# Altium schematic symbol library jlcpcb_2025_04_resistors_extended_0201.schlib: 1508 symbols (part 4 of 8)
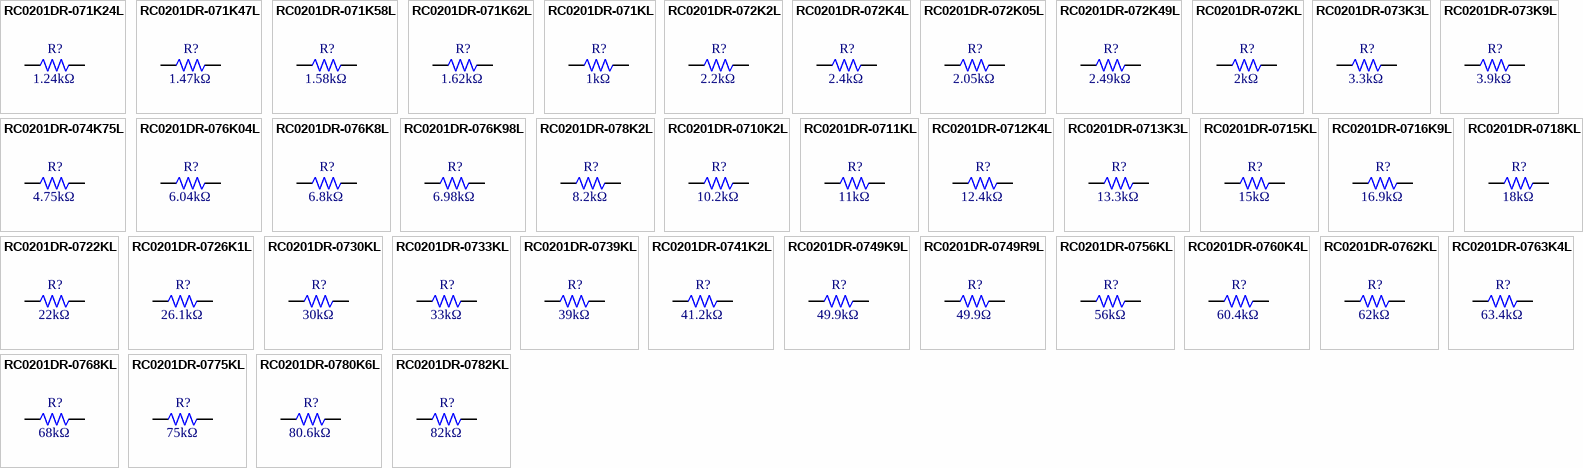
[diagram p40: symbols RC0201DR-071K24L to RC0201DR-0782KL]

## RC0201DR-0739KL
designator R?  Resistance: 39kΩ  (hidden comment: *)
Resistor, 39kΩ, ±0.5%, 50mW, ±200ppm/℃, -55℃~+125℃, SMD 0201; Manufacturer: Uniroyal; Manufacturer Part Number: RC0201DR-0739KL; Supplier 1: LCSC; Supplier Part Number 1: C851727; JLCPCB Part Number: C851727; Power Rating: 50mW; Category: Resistors; Package Size: 0201; JLCPCB Basic Part: Yes; Tolerance: ±0.5%; Temperature Coefficient: ±200ppm/℃; Temperature Rating: -55℃~+125℃; ComponentLink1Description: Datasheet; ComponentLink1URL: https://wmsc.lcsc.com/wmsc/upload/file/pdf/v2/lcsc/2207080300_YAGEO-RC0201DR-0739KL_C851727.pdf; ComponentLink2Description: JLCPCB Part URL; ComponentLink2URL: https://jlcpcb.com/partdetail/C851727
pins: 1, 2
1 alternate drawing of the same symbol

## RC0201DR-0741K2L
designator R?  Resistance: 41.2kΩ  (hidden comment: *)
Resistor, 41.2kΩ, ±0.5%, 50mW, ±200ppm/℃, -55℃~+125℃, SMD 0201; Manufacturer: Uniroyal; Manufacturer Part Number: RC0201DR-0741K2L; Supplier 1: LCSC; Supplier Part Number 1: C851736; JLCPCB Part Number: C851736; Power Rating: 50mW; Category: Resistors; Package Size: 0201; JLCPCB Basic Part: Yes; Tolerance: ±0.5%; Temperature Coefficient: ±200ppm/℃; Temperature Rating: -55℃~+125℃; ComponentLink1Description: Datasheet; ComponentLink1URL: https://wmsc.lcsc.com/wmsc/upload/file/pdf/v2/lcsc/2210190401_YAGEO-RC0201DR-0741K2L_C851736.pdf; ComponentLink2Description: JLCPCB Part URL; ComponentLink2URL: https://jlcpcb.com/partdetail/C851736
pins: 1, 2
1 alternate drawing of the same symbol

## RC0201DR-0749K9L
designator R?  Resistance: 49.9kΩ  (hidden comment: *)
Resistor, 49.9kΩ, ±0.5%, 50mW, ±200ppm/℃, -55℃~+125℃, SMD 0201; Manufacturer: Uniroyal; Manufacturer Part Number: RC0201DR-0749K9L; Supplier 1: LCSC; Supplier Part Number 1: C851750; JLCPCB Part Number: C851750; Power Rating: 50mW; Category: Resistors; Package Size: 0201; JLCPCB Basic Part: Yes; Tolerance: ±0.5%; Temperature Coefficient: ±200ppm/℃; Temperature Rating: -55℃~+125℃; ComponentLink1Description: Datasheet; ComponentLink1URL: https://wmsc.lcsc.com/wmsc/upload/file/pdf/v2/lcsc/2210190401_YAGEO-RC0201DR-0749K9L_C851750.pdf; ComponentLink2Description: JLCPCB Part URL; ComponentLink2URL: https://jlcpcb.com/partdetail/C851750
pins: 1, 2
1 alternate drawing of the same symbol

## RC0201DR-0749R9L
designator R?  Resistance: 49.9Ω  (hidden comment: *)
Resistor, 49.9Ω, ±0.5%, 50mW, 25V, ±200ppm/℃, -55℃~+125℃, SMD 0201; Manufacturer: Uniroyal; Manufacturer Part Number: RC0201DR-0749R9L; Supplier 1: LCSC; Supplier Part Number 1: C851751; JLCPCB Part Number: C851751; Power Rating: 50mW; Category: Resistors; Package Size: 0201; JLCPCB Basic Part: Yes; Tolerance: ±0.5%; Voltage Rating: 25V; Temperature Coefficient: ±200ppm/℃; Temperature Rating: -55℃~+125℃; ComponentLink1Description: Datasheet; ComponentLink1URL: https://wmsc.lcsc.com/wmsc/upload/file/pdf/v2/lcsc/2203031730_YAGEO-RC0201DR-0749R9L_C851751.pdf; ComponentLink2Description: JLCPCB Part URL; ComponentLink2URL: https://jlcpcb.com/partdetail/C851751
pins: 1, 2
1 alternate drawing of the same symbol

## RC0201DR-0756KL
designator R?  Resistance: 56kΩ  (hidden comment: *)
Resistor, 56kΩ, ±0.5%, 50mW, 25V, ±200ppm/℃, -55℃~+125℃, SMD 0201; Manufacturer: Uniroyal; Manufacturer Part Number: RC0201DR-0756KL; Supplier 1: LCSC; Supplier Part Number 1: C851761; JLCPCB Part Number: C851761; Power Rating: 50mW; Category: Resistors; Package Size: 0201; JLCPCB Basic Part: Yes; Tolerance: ±0.5%; Voltage Rating: 25V; Temperature Coefficient: ±200ppm/℃; Temperature Rating: -55℃~+125℃; ComponentLink1Description: Datasheet; ComponentLink1URL: https://wmsc.lcsc.com/wmsc/upload/file/pdf/v2/lcsc/2203031730_YAGEO-RC0201DR-0756KL_C851761.pdf; ComponentLink2Description: JLCPCB Part URL; ComponentLink2URL: https://jlcpcb.com/partdetail/C851761
pins: 1, 2
1 alternate drawing of the same symbol

## RC0201DR-0760K4L
designator R?  Resistance: 60.4kΩ  (hidden comment: *)
Resistor, 60.4kΩ, ±0.5%, 50mW, 25V, ±200ppm/℃, -55℃~+125℃, SMD 0201; Manufacturer: Uniroyal; Manufacturer Part Number: RC0201DR-0760K4L; Supplier 1: LCSC; Supplier Part Number 1: C2110918; JLCPCB Part Number: C2110918; Power Rating: 50mW; Category: Resistors; Package Size: 0201; JLCPCB Basic Part: Yes; Tolerance: ±0.5%; Voltage Rating: 25V; Temperature Coefficient: ±200ppm/℃; Temperature Rating: -55℃~+125℃; ComponentLink1Description: Datasheet; ComponentLink1URL: https://wmsc.lcsc.com/wmsc/upload/file/pdf/v2/lcsc/2202021530_YAGEO-RC0201DR-0760K4L_C2110918.pdf; ComponentLink2Description: JLCPCB Part URL; ComponentLink2URL: https://jlcpcb.com/partdetail/C2110918
pins: 1, 2
1 alternate drawing of the same symbol

## RC0201DR-0762KL
designator R?  Resistance: 62kΩ  (hidden comment: *)
Resistor, 62kΩ, ±0.5%, 50mW, ±200ppm/℃, -55℃~+125℃, SMD 0201; Manufacturer: Uniroyal; Manufacturer Part Number: RC0201DR-0762KL; Supplier 1: LCSC; Supplier Part Number 1: C851773; JLCPCB Part Number: C851773; Power Rating: 50mW; Category: Resistors; Package Size: 0201; JLCPCB Basic Part: Yes; Tolerance: ±0.5%; Temperature Coefficient: ±200ppm/℃; Temperature Rating: -55℃~+125℃; ComponentLink1Description: Datasheet; ComponentLink1URL: https://wmsc.lcsc.com/wmsc/upload/file/pdf/v2/lcsc/2210190401_YAGEO-RC0201DR-0762KL_C851773.pdf; ComponentLink2Description: JLCPCB Part URL; ComponentLink2URL: https://jlcpcb.com/partdetail/C851773
pins: 1, 2
1 alternate drawing of the same symbol

## RC0201DR-0763K4L
designator R?  Resistance: 63.4kΩ  (hidden comment: *)
Resistor, 63.4kΩ, ±0.5%, 50mW, ±200ppm/℃, -55℃~+125℃, SMD 0201; Manufacturer: Uniroyal; Manufacturer Part Number: RC0201DR-0763K4L; Supplier 1: LCSC; Supplier Part Number 1: C851774; JLCPCB Part Number: C851774; Power Rating: 50mW; Category: Resistors; Package Size: 0201; JLCPCB Basic Part: Yes; Tolerance: ±0.5%; Temperature Coefficient: ±200ppm/℃; Temperature Rating: -55℃~+125℃; ComponentLink1Description: Datasheet; ComponentLink1URL: https://wmsc.lcsc.com/wmsc/upload/file/pdf/v2/lcsc/2210190401_YAGEO-RC0201DR-0763K4L_C851774.pdf; ComponentLink2Description: JLCPCB Part URL; ComponentLink2URL: https://jlcpcb.com/partdetail/C851774
pins: 1, 2
1 alternate drawing of the same symbol

## RC0201DR-0768KL
designator R?  Resistance: 68kΩ  (hidden comment: *)
Resistor, 68kΩ, ±0.5%, 50mW, ±200ppm/℃, -55℃~+125℃, SMD 0201; Manufacturer: Uniroyal; Manufacturer Part Number: RC0201DR-0768KL; Supplier 1: LCSC; Supplier Part Number 1: C851782; JLCPCB Part Number: C851782; Power Rating: 50mW; Category: Resistors; Package Size: 0201; JLCPCB Basic Part: Yes; Tolerance: ±0.5%; Temperature Coefficient: ±200ppm/℃; Temperature Rating: -55℃~+125℃; ComponentLink1Description: Datasheet; ComponentLink1URL: https://wmsc.lcsc.com/wmsc/upload/file/pdf/v2/lcsc/2210190401_YAGEO-RC0201DR-0768KL_C851782.pdf; ComponentLink2Description: JLCPCB Part URL; ComponentLink2URL: https://jlcpcb.com/partdetail/C851782
pins: 1, 2
1 alternate drawing of the same symbol

## RC0201DR-0775KL
designator R?  Resistance: 75kΩ  (hidden comment: *)
Resistor, 75kΩ, ±0.5%, 50mW, ±200ppm/℃, -55℃~+125℃, SMD 0201; Manufacturer: Uniroyal; Manufacturer Part Number: RC0201DR-0775KL; Supplier 1: LCSC; Supplier Part Number 1: C851792; JLCPCB Part Number: C851792; Power Rating: 50mW; Category: Resistors; Package Size: 0201; JLCPCB Basic Part: Yes; Tolerance: ±0.5%; Temperature Coefficient: ±200ppm/℃; Temperature Rating: -55℃~+125℃; ComponentLink1Description: Datasheet; ComponentLink1URL: https://wmsc.lcsc.com/wmsc/upload/file/pdf/v2/lcsc/2210190401_YAGEO-RC0201DR-0775KL_C851792.pdf; ComponentLink2Description: JLCPCB Part URL; ComponentLink2URL: https://jlcpcb.com/partdetail/C851792
pins: 1, 2
1 alternate drawing of the same symbol

## RC0201DR-0780K6L
designator R?  Resistance: 80.6kΩ  (hidden comment: *)
Resistor, 80.6kΩ, ±0.5%, 50mW, ±200ppm/℃, -55℃~+125℃, SMD 0201; Manufacturer: Uniroyal; Manufacturer Part Number: RC0201DR-0780K6L; Supplier 1: LCSC; Supplier Part Number 1: C851797; JLCPCB Part Number: C851797; Power Rating: 50mW; Category: Resistors; Package Size: 0201; JLCPCB Basic Part: Yes; Tolerance: ±0.5%; Temperature Coefficient: ±200ppm/℃; Temperature Rating: -55℃~+125℃; ComponentLink1Description: Datasheet; ComponentLink1URL: https://wmsc.lcsc.com/wmsc/upload/file/pdf/v2/lcsc/2311211101_YAGEO-RC0201DR-0780K6L_C851797.pdf; ComponentLink2Description: JLCPCB Part URL; ComponentLink2URL: https://jlcpcb.com/partdetail/C851797
pins: 1, 2
1 alternate drawing of the same symbol

## RC0201DR-0782KL
designator R?  Resistance: 82kΩ  (hidden comment: *)
Resistor, 82kΩ, ±0.5%, 50mW, ±200ppm/℃, -55℃~+125℃, SMD 0201; Manufacturer: Uniroyal; Manufacturer Part Number: RC0201DR-0782KL; Supplier 1: LCSC; Supplier Part Number 1: C851800; JLCPCB Part Number: C851800; Power Rating: 50mW; Category: Resistors; Package Size: 0201; JLCPCB Basic Part: Yes; Tolerance: ±0.5%; Temperature Coefficient: ±200ppm/℃; Temperature Rating: -55℃~+125℃; ComponentLink1Description: Datasheet; ComponentLink1URL: https://wmsc.lcsc.com/wmsc/upload/file/pdf/v2/lcsc/2210190401_YAGEO-RC0201DR-0782KL_C851800.pdf; ComponentLink2Description: JLCPCB Part URL; ComponentLink2URL: https://jlcpcb.com/partdetail/C851800
pins: 1, 2
1 alternate drawing of the same symbol

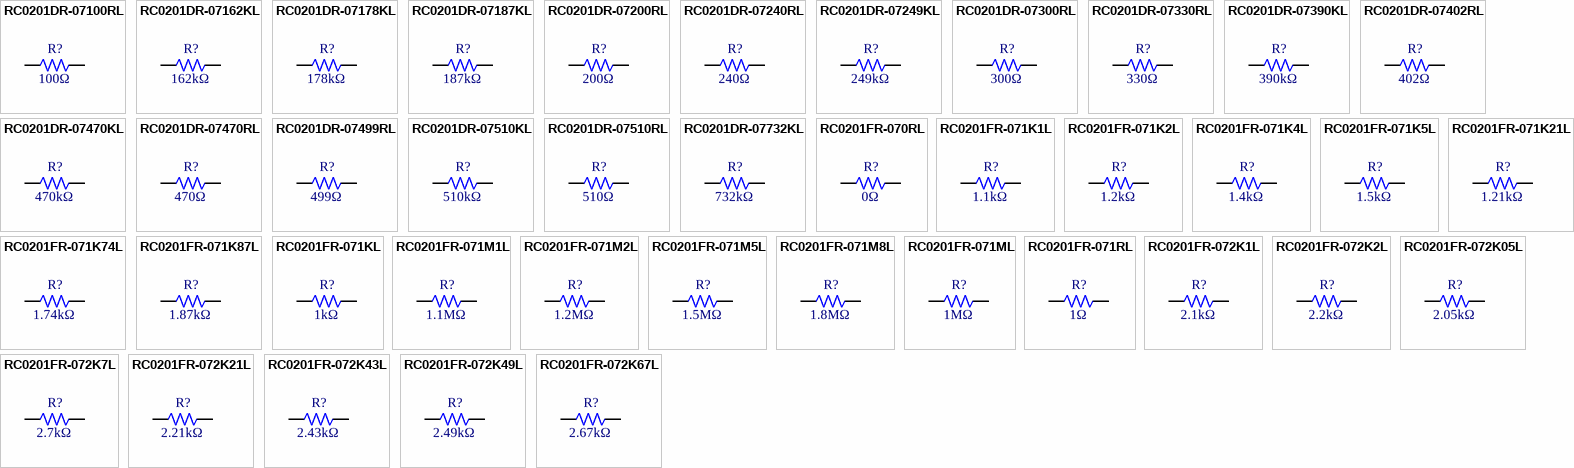
[diagram p15: symbols RC0201DR-07100RL to RC0201FR-072K67L]

## RC0201DR-07100RL
designator R?  Resistance: 100Ω  (hidden comment: *)
Resistor, 100Ω, ±0.5%, 50mW, ±200ppm/℃, -55℃~+125℃, SMD 0201; Manufacturer: Uniroyal; Manufacturer Part Number: RC0201DR-07100RL; Supplier 1: LCSC; Supplier Part Number 1: C851634; JLCPCB Part Number: C851634; Power Rating: 50mW; Category: Resistors; Package Size: 0201; JLCPCB Basic Part: Yes; Tolerance: ±0.5%; Temperature Coefficient: ±200ppm/℃; Temperature Rating: -55℃~+125℃; ComponentLink1Description: Datasheet; ComponentLink1URL: https://wmsc.lcsc.com/wmsc/upload/file/pdf/v2/lcsc/2210190401_YAGEO-RC0201DR-07100RL_C851634.pdf; ComponentLink2Description: JLCPCB Part URL; ComponentLink2URL: https://jlcpcb.com/partdetail/C851634
pins: 1, 2
1 alternate drawing of the same symbol

## RC0201DR-07162KL
designator R?  Resistance: 162kΩ  (hidden comment: *)
Resistor, 162kΩ, ±0.5%, 50mW, 25V, ±200ppm/℃, -55℃~+125℃, SMD 0201; Manufacturer: Uniroyal; Manufacturer Part Number: RC0201DR-07162KL; Supplier 1: LCSC; Supplier Part Number 1: C2108610; JLCPCB Part Number: C2108610; Power Rating: 50mW; Category: Resistors; Package Size: 0201; JLCPCB Basic Part: Yes; Tolerance: ±0.5%; Voltage Rating: 25V; Temperature Coefficient: ±200ppm/℃; Temperature Rating: -55℃~+125℃; ComponentLink1Description: Datasheet; ComponentLink1URL: https://wmsc.lcsc.com/wmsc/upload/file/pdf/v2/lcsc/2202021400_YAGEO-RC0201DR-07162KL_C2108610.pdf; ComponentLink2Description: JLCPCB Part URL; ComponentLink2URL: https://jlcpcb.com/partdetail/C2108610
pins: 1, 2
1 alternate drawing of the same symbol

## RC0201DR-07178KL
designator R?  Resistance: 178kΩ  (hidden comment: *)
Resistor, 178kΩ, ±0.5%, 50mW, ±200ppm/℃, -55℃~+125℃, SMD 0201; Manufacturer: Uniroyal; Manufacturer Part Number: RC0201DR-07178KL; Supplier 1: LCSC; Supplier Part Number 1: C851659; JLCPCB Part Number: C851659; Power Rating: 50mW; Category: Resistors; Package Size: 0201; JLCPCB Basic Part: Yes; Tolerance: ±0.5%; Temperature Coefficient: ±200ppm/℃; Temperature Rating: -55℃~+125℃; ComponentLink1Description: Datasheet; ComponentLink1URL: https://wmsc.lcsc.com/wmsc/upload/file/pdf/v2/lcsc/2210190401_YAGEO-RC0201DR-07178KL_C851659.pdf; ComponentLink2Description: JLCPCB Part URL; ComponentLink2URL: https://jlcpcb.com/partdetail/C851659
pins: 1, 2
1 alternate drawing of the same symbol

## RC0201DR-07187KL
designator R?  Resistance: 187kΩ  (hidden comment: *)
Resistor, 187kΩ, ±0.5%, 50mW, ±200ppm/℃, -55℃~+125℃, SMD 0201; Manufacturer: Uniroyal; Manufacturer Part Number: RC0201DR-07187KL; Supplier 1: LCSC; Supplier Part Number 1: C851661; JLCPCB Part Number: C851661; Power Rating: 50mW; Category: Resistors; Package Size: 0201; JLCPCB Basic Part: Yes; Tolerance: ±0.5%; Temperature Coefficient: ±200ppm/℃; Temperature Rating: -55℃~+125℃; ComponentLink1Description: Datasheet; ComponentLink1URL: https://wmsc.lcsc.com/wmsc/upload/file/pdf/v2/lcsc/2210190401_YAGEO-RC0201DR-07187KL_C851661.pdf; ComponentLink2Description: JLCPCB Part URL; ComponentLink2URL: https://jlcpcb.com/partdetail/C851661
pins: 1, 2
1 alternate drawing of the same symbol

## RC0201DR-07200RL
designator R?  Resistance: 200Ω  (hidden comment: *)
Resistor, 200Ω, ±0.5%, 50mW, ±200ppm/℃, -55℃~+125℃, SMD 0201; Manufacturer: Uniroyal; Manufacturer Part Number: RC0201DR-07200RL; Supplier 1: LCSC; Supplier Part Number 1: C851677; JLCPCB Part Number: C851677; Power Rating: 50mW; Category: Resistors; Package Size: 0201; JLCPCB Basic Part: Yes; Tolerance: ±0.5%; Temperature Coefficient: ±200ppm/℃; Temperature Rating: -55℃~+125℃; ComponentLink1Description: Datasheet; ComponentLink1URL: https://wmsc.lcsc.com/wmsc/upload/file/pdf/v2/lcsc/2210190401_YAGEO-RC0201DR-07200RL_C851677.pdf; ComponentLink2Description: JLCPCB Part URL; ComponentLink2URL: https://jlcpcb.com/partdetail/C851677
pins: 1, 2
1 alternate drawing of the same symbol

## RC0201DR-07240RL
designator R?  Resistance: 240Ω  (hidden comment: *)
Resistor, 240Ω, ±0.5%, 50mW, ±200ppm/℃, -55℃~+125℃, SMD 0201; Manufacturer: Uniroyal; Manufacturer Part Number: RC0201DR-07240RL; Supplier 1: LCSC; Supplier Part Number 1: C851687; JLCPCB Part Number: C851687; Power Rating: 50mW; Category: Resistors; Package Size: 0201; JLCPCB Basic Part: Yes; Tolerance: ±0.5%; Temperature Coefficient: ±200ppm/℃; Temperature Rating: -55℃~+125℃; ComponentLink1Description: Datasheet; ComponentLink1URL: https://wmsc.lcsc.com/wmsc/upload/file/pdf/v2/lcsc/2311211101_YAGEO-RC0201DR-07240RL_C851687.pdf; ComponentLink2Description: JLCPCB Part URL; ComponentLink2URL: https://jlcpcb.com/partdetail/C851687
pins: 1, 2
1 alternate drawing of the same symbol

## RC0201DR-07249KL
designator R?  Resistance: 249kΩ  (hidden comment: *)
Resistor, 249kΩ, ±0.5%, 50mW, 25V, ±200ppm/℃, -55℃~+125℃, SMD 0201; Manufacturer: Uniroyal; Manufacturer Part Number: RC0201DR-07249KL; Supplier 1: LCSC; Supplier Part Number 1: C2108970; JLCPCB Part Number: C2108970; Power Rating: 50mW; Category: Resistors; Package Size: 0201; JLCPCB Basic Part: Yes; Tolerance: ±0.5%; Voltage Rating: 25V; Temperature Coefficient: ±200ppm/℃; Temperature Rating: -55℃~+125℃; ComponentLink1Description: Datasheet; ComponentLink1URL: https://wmsc.lcsc.com/wmsc/upload/file/pdf/v2/lcsc/2202021400_YAGEO-RC0201DR-07249KL_C2108970.pdf; ComponentLink2Description: JLCPCB Part URL; ComponentLink2URL: https://jlcpcb.com/partdetail/C2108970
pins: 1, 2
1 alternate drawing of the same symbol

## RC0201DR-07300RL
designator R?  Resistance: 300Ω  (hidden comment: *)
Resistor, 300Ω, ±0.5%, 50mW, ±200ppm/℃, -55℃~+125℃, SMD 0201; Manufacturer: Uniroyal; Manufacturer Part Number: RC0201DR-07300RL; Supplier 1: LCSC; Supplier Part Number 1: C851711; JLCPCB Part Number: C851711; Power Rating: 50mW; Category: Resistors; Package Size: 0201; JLCPCB Basic Part: Yes; Tolerance: ±0.5%; Temperature Coefficient: ±200ppm/℃; Temperature Rating: -55℃~+125℃; ComponentLink1Description: Datasheet; ComponentLink1URL: https://wmsc.lcsc.com/wmsc/upload/file/pdf/v2/lcsc/2210190401_YAGEO-RC0201DR-07300RL_C851711.pdf; ComponentLink2Description: JLCPCB Part URL; ComponentLink2URL: https://jlcpcb.com/partdetail/C851711
pins: 1, 2
1 alternate drawing of the same symbol

## RC0201DR-07330RL
designator R?  Resistance: 330Ω  (hidden comment: *)
Resistor, 330Ω, ±0.5%, 50mW, 25V, ±200ppm/℃, -55℃~+125℃, SMD 0201; Manufacturer: Uniroyal; Manufacturer Part Number: RC0201DR-07330RL; Supplier 1: LCSC; Supplier Part Number 1: C851717; JLCPCB Part Number: C851717; Power Rating: 50mW; Category: Resistors; Package Size: 0201; JLCPCB Basic Part: Yes; Tolerance: ±0.5%; Voltage Rating: 25V; Temperature Coefficient: ±200ppm/℃; Temperature Rating: -55℃~+125℃; ComponentLink1Description: Datasheet; ComponentLink1URL: https://wmsc.lcsc.com/wmsc/upload/file/pdf/v2/lcsc/2203031730_YAGEO-RC0201DR-07330RL_C851717.pdf; ComponentLink2Description: JLCPCB Part URL; ComponentLink2URL: https://jlcpcb.com/partdetail/C851717
pins: 1, 2
1 alternate drawing of the same symbol

## RC0201DR-07390KL
designator R?  Resistance: 390kΩ  (hidden comment: *)
Resistor, 390kΩ, ±0.5%, 50mW, ±200ppm/℃, -55℃~+125℃, SMD 0201; Manufacturer: Uniroyal; Manufacturer Part Number: RC0201DR-07390KL; Supplier 1: LCSC; Supplier Part Number 1: C851726; JLCPCB Part Number: C851726; Power Rating: 50mW; Category: Resistors; Package Size: 0201; JLCPCB Basic Part: Yes; Tolerance: ±0.5%; Temperature Coefficient: ±200ppm/℃; Temperature Rating: -55℃~+125℃; ComponentLink1Description: Datasheet; ComponentLink1URL: https://wmsc.lcsc.com/wmsc/upload/file/pdf/v2/lcsc/2210190401_YAGEO-RC0201DR-07390KL_C851726.pdf; ComponentLink2Description: JLCPCB Part URL; ComponentLink2URL: https://jlcpcb.com/partdetail/C851726
pins: 1, 2
1 alternate drawing of the same symbol

## RC0201DR-07402RL
designator R?  Resistance: 402Ω  (hidden comment: *)
Resistor, 402Ω, ±0.5%, 50mW, ±200ppm/℃, -55℃~+125℃, SMD 0201; Manufacturer: Uniroyal; Manufacturer Part Number: RC0201DR-07402RL; Supplier 1: LCSC; Supplier Part Number 1: C851735; JLCPCB Part Number: C851735; Power Rating: 50mW; Category: Resistors; Package Size: 0201; JLCPCB Basic Part: Yes; Tolerance: ±0.5%; Temperature Coefficient: ±200ppm/℃; Temperature Rating: -55℃~+125℃; ComponentLink1Description: Datasheet; ComponentLink1URL: https://wmsc.lcsc.com/wmsc/upload/file/pdf/v2/lcsc/2210190401_YAGEO-RC0201DR-07402RL_C851735.pdf; ComponentLink2Description: JLCPCB Part URL; ComponentLink2URL: https://jlcpcb.com/partdetail/C851735
pins: 1, 2
1 alternate drawing of the same symbol

## RC0201DR-07470KL
designator R?  Resistance: 470kΩ  (hidden comment: *)
Resistor, 470kΩ, ±0.5%, 50mW, 25V, ±200ppm/℃, -55℃~+125℃, SMD 0201; Manufacturer: Uniroyal; Manufacturer Part Number: RC0201DR-07470KL; Supplier 1: LCSC; Supplier Part Number 1: C851745; JLCPCB Part Number: C851745; Power Rating: 50mW; Category: Resistors; Package Size: 0201; JLCPCB Basic Part: Yes; Tolerance: ±0.5%; Voltage Rating: 25V; Temperature Coefficient: ±200ppm/℃; Temperature Rating: -55℃~+125℃; ComponentLink1Description: Datasheet; ComponentLink1URL: https://wmsc.lcsc.com/wmsc/upload/file/pdf/v2/lcsc/2304140030_YAGEO-RC0201DR-07470KL_C851745.pdf; ComponentLink2Description: JLCPCB Part URL; ComponentLink2URL: https://jlcpcb.com/partdetail/C851745
pins: 1, 2
1 alternate drawing of the same symbol

## RC0201DR-07470RL
designator R?  Resistance: 470Ω  (hidden comment: *)
Resistor, 470Ω, ±0.5%, 50mW, ±200ppm/℃, -55℃~+125℃, SMD 0201; Manufacturer: Uniroyal; Manufacturer Part Number: RC0201DR-07470RL; Supplier 1: LCSC; Supplier Part Number 1: C851746; JLCPCB Part Number: C851746; Power Rating: 50mW; Category: Resistors; Package Size: 0201; JLCPCB Basic Part: Yes; Tolerance: ±0.5%; Temperature Coefficient: ±200ppm/℃; Temperature Rating: -55℃~+125℃; ComponentLink1Description: Datasheet; ComponentLink1URL: https://wmsc.lcsc.com/wmsc/upload/file/pdf/v2/lcsc/2210190401_YAGEO-RC0201DR-07470RL_C851746.pdf; ComponentLink2Description: JLCPCB Part URL; ComponentLink2URL: https://jlcpcb.com/partdetail/C851746
pins: 1, 2
1 alternate drawing of the same symbol

## RC0201DR-07499RL
designator R?  Resistance: 499Ω  (hidden comment: *)
Resistor, 499Ω, ±0.5%, 50mW, ±200ppm/℃, -55℃~+125℃, SMD 0201; Manufacturer: Uniroyal; Manufacturer Part Number: RC0201DR-07499RL; Supplier 1: LCSC; Supplier Part Number 1: C851749; JLCPCB Part Number: C851749; Power Rating: 50mW; Category: Resistors; Package Size: 0201; JLCPCB Basic Part: Yes; Tolerance: ±0.5%; Temperature Coefficient: ±200ppm/℃; Temperature Rating: -55℃~+125℃; ComponentLink1Description: Datasheet; ComponentLink1URL: https://wmsc.lcsc.com/wmsc/upload/file/pdf/v2/lcsc/2210190401_YAGEO-RC0201DR-07499RL_C851749.pdf; ComponentLink2Description: JLCPCB Part URL; ComponentLink2URL: https://jlcpcb.com/partdetail/C851749
pins: 1, 2
1 alternate drawing of the same symbol

## RC0201DR-07510KL
designator R?  Resistance: 510kΩ  (hidden comment: *)
Resistor, 510kΩ, ±0.5%, 50mW, ±200ppm/℃, -55℃~+125℃, SMD 0201; Manufacturer: Uniroyal; Manufacturer Part Number: RC0201DR-07510KL; Supplier 1: LCSC; Supplier Part Number 1: C851756; JLCPCB Part Number: C851756; Power Rating: 50mW; Category: Resistors; Package Size: 0201; JLCPCB Basic Part: Yes; Tolerance: ±0.5%; Temperature Coefficient: ±200ppm/℃; Temperature Rating: -55℃~+125℃; ComponentLink1Description: Datasheet; ComponentLink1URL: https://wmsc.lcsc.com/wmsc/upload/file/pdf/v2/lcsc/2210190401_YAGEO-RC0201DR-07510KL_C851756.pdf; ComponentLink2Description: JLCPCB Part URL; ComponentLink2URL: https://jlcpcb.com/partdetail/C851756
pins: 1, 2
1 alternate drawing of the same symbol

## RC0201DR-07510RL
designator R?  Resistance: 510Ω  (hidden comment: *)
Resistor, 510Ω, ±0.5%, 50mW, ±200ppm/℃, -55℃~+125℃, SMD 0201; Manufacturer: Uniroyal; Manufacturer Part Number: RC0201DR-07510RL; Supplier 1: LCSC; Supplier Part Number 1: C851757; JLCPCB Part Number: C851757; Power Rating: 50mW; Category: Resistors; Package Size: 0201; JLCPCB Basic Part: Yes; Tolerance: ±0.5%; Temperature Coefficient: ±200ppm/℃; Temperature Rating: -55℃~+125℃; ComponentLink1Description: Datasheet; ComponentLink1URL: https://wmsc.lcsc.com/wmsc/upload/file/pdf/v2/lcsc/2210190401_YAGEO-RC0201DR-07510RL_C851757.pdf; ComponentLink2Description: JLCPCB Part URL; ComponentLink2URL: https://jlcpcb.com/partdetail/C851757
pins: 1, 2
1 alternate drawing of the same symbol

## RC0201DR-07732KL
designator R?  Resistance: 732kΩ  (hidden comment: *)
Resistor, 732kΩ, ±0.5%, 50mW, ±200ppm/℃, -55℃~+125℃, SMD 0201; Manufacturer: Uniroyal; Manufacturer Part Number: RC0201DR-07732KL; Supplier 1: LCSC; Supplier Part Number 1: C851791; JLCPCB Part Number: C851791; Power Rating: 50mW; Category: Resistors; Package Size: 0201; JLCPCB Basic Part: Yes; Tolerance: ±0.5%; Temperature Coefficient: ±200ppm/℃; Temperature Rating: -55℃~+125℃; ComponentLink1Description: Datasheet; ComponentLink1URL: https://wmsc.lcsc.com/wmsc/upload/file/pdf/v2/lcsc/2210190401_YAGEO-RC0201DR-07732KL_C851791.pdf; ComponentLink2Description: JLCPCB Part URL; ComponentLink2URL: https://jlcpcb.com/partdetail/C851791
pins: 1, 2
1 alternate drawing of the same symbol

## RC0201FR-070RL
designator R?  Resistance: 0Ω  (hidden comment: *)
Resistor, 0Ω, 50mW, 25V, -55℃~+125℃, SMD 0201; Manufacturer: Uniroyal; Manufacturer Part Number: RC0201FR-070RL; Supplier 1: LCSC; Supplier Part Number 1: C106227; JLCPCB Part Number: C106227; Power Rating: 50mW; Category: Resistors; Package Size: 0201; JLCPCB Basic Part: Yes; Voltage Rating: 25V; Temperature Rating: -55℃~+125℃; ComponentLink1Description: Datasheet; ComponentLink1URL: https://wmsc.lcsc.com/wmsc/upload/file/pdf/v2/lcsc/2304140030_YAGEO-RC0201FR-070RL_C106227.pdf; ComponentLink2Description: JLCPCB Part URL; ComponentLink2URL: https://jlcpcb.com/partdetail/C106227
pins: 1, 2
1 alternate drawing of the same symbol

## RC0201FR-071K1L
designator R?  Resistance: 1.1kΩ  (hidden comment: *)
Resistor, 1.1kΩ, ±1%, 50mW, 25V, ±200ppm/℃, -55℃~+125℃, SMD 0201; Manufacturer: Uniroyal; Manufacturer Part Number: RC0201FR-071K1L; Supplier 1: LCSC; Supplier Part Number 1: C295782; JLCPCB Part Number: C295782; Power Rating: 50mW; Category: Resistors; Package Size: 0201; JLCPCB Basic Part: Yes; Tolerance: ±1%; Voltage Rating: 25V; Temperature Coefficient: ±200ppm/℃; Temperature Rating: -55℃~+125℃; ComponentLink1Description: Datasheet; ComponentLink1URL: https://wmsc.lcsc.com/wmsc/upload/file/pdf/v2/lcsc/2304140030_YAGEO-RC0201FR-071K1L_C295782.pdf; ComponentLink2Description: JLCPCB Part URL; ComponentLink2URL: https://jlcpcb.com/partdetail/C295782
pins: 1, 2
1 alternate drawing of the same symbol

## RC0201FR-071K2L
designator R?  Resistance: 1.2kΩ  (hidden comment: *)
Resistor, 1.2kΩ, ±1%, 50mW, 25V, ±200ppm/℃, -55℃~+125℃, SMD 0201; Manufacturer: Uniroyal; Manufacturer Part Number: RC0201FR-071K2L; Supplier 1: LCSC; Supplier Part Number 1: C327393; JLCPCB Part Number: C327393; Power Rating: 50mW; Category: Resistors; Package Size: 0201; JLCPCB Basic Part: Yes; Tolerance: ±1%; Voltage Rating: 25V; Temperature Coefficient: ±200ppm/℃; Temperature Rating: -55℃~+125℃; ComponentLink1Description: Datasheet; ComponentLink1URL: https://wmsc.lcsc.com/wmsc/upload/file/pdf/v2/lcsc/1811141154_YAGEO-RC0201FR-071K2L_C327393.pdf; ComponentLink2Description: JLCPCB Part URL; ComponentLink2URL: https://jlcpcb.com/partdetail/C327393
pins: 1, 2
1 alternate drawing of the same symbol

## RC0201FR-071K4L
designator R?  Resistance: 1.4kΩ  (hidden comment: *)
Resistor, 1.4kΩ, ±1%, 50mW, 25V, ±200ppm/℃, -55℃~+125℃, SMD 0201; Manufacturer: Uniroyal; Manufacturer Part Number: RC0201FR-071K4L; Supplier 1: LCSC; Supplier Part Number 1: C138166; JLCPCB Part Number: C138166; Power Rating: 50mW; Category: Resistors; Package Size: 0201; JLCPCB Basic Part: Yes; Tolerance: ±1%; Voltage Rating: 25V; Temperature Coefficient: ±200ppm/℃; Temperature Rating: -55℃~+125℃; ComponentLink1Description: Datasheet; ComponentLink1URL: https://wmsc.lcsc.com/wmsc/upload/file/pdf/v2/lcsc/2304140030_YAGEO-RC0201FR-071K4L_C138166.pdf; ComponentLink2Description: JLCPCB Part URL; ComponentLink2URL: https://jlcpcb.com/partdetail/C138166
pins: 1, 2
1 alternate drawing of the same symbol

## RC0201FR-071K5L
designator R?  Resistance: 1.5kΩ  (hidden comment: *)
Resistor, 1.5kΩ, ±1%, 50mW, 25V, ±200ppm/℃, -55℃~+125℃, SMD 0201; Manufacturer: Uniroyal; Manufacturer Part Number: RC0201FR-071K5L; Supplier 1: LCSC; Supplier Part Number 1: C155737; JLCPCB Part Number: C155737; Power Rating: 50mW; Category: Resistors; Package Size: 0201; JLCPCB Basic Part: Yes; Tolerance: ±1%; Voltage Rating: 25V; Temperature Coefficient: ±200ppm/℃; Temperature Rating: -55℃~+125℃; ComponentLink1Description: Datasheet; ComponentLink1URL: https://wmsc.lcsc.com/wmsc/upload/file/pdf/v2/lcsc/2011101005_YAGEO-RC0201FR-071K5L_C155737.pdf; ComponentLink2Description: JLCPCB Part URL; ComponentLink2URL: https://jlcpcb.com/partdetail/C155737
pins: 1, 2
1 alternate drawing of the same symbol

## RC0201FR-071K21L
designator R?  Resistance: 1.21kΩ  (hidden comment: *)
Resistor, 1.21kΩ, ±1%, 50mW, 25V, ±200ppm/℃, -55℃~+125℃, SMD 0201; Manufacturer: Uniroyal; Manufacturer Part Number: RC0201FR-071K21L; Supplier 1: LCSC; Supplier Part Number 1: C273264; JLCPCB Part Number: C273264; Power Rating: 50mW; Category: Resistors; Package Size: 0201; JLCPCB Basic Part: Yes; Tolerance: ±1%; Voltage Rating: 25V; Temperature Coefficient: ±200ppm/℃; Temperature Rating: -55℃~+125℃; ComponentLink1Description: Datasheet; ComponentLink1URL: https://wmsc.lcsc.com/wmsc/upload/file/pdf/v2/lcsc/2202281730_YAGEO-RC0201FR-071K21L_C273264.pdf; ComponentLink2Description: JLCPCB Part URL; ComponentLink2URL: https://jlcpcb.com/partdetail/C273264
pins: 1, 2
1 alternate drawing of the same symbol

## RC0201FR-071K74L
designator R?  Resistance: 1.74kΩ  (hidden comment: *)
Resistor, 1.74kΩ, ±1%, 50mW, 25V, ±200ppm/℃, -55℃~+125℃, SMD 0201; Manufacturer: Uniroyal; Manufacturer Part Number: RC0201FR-071K74L; Supplier 1: LCSC; Supplier Part Number 1: C327378; JLCPCB Part Number: C327378; Power Rating: 50mW; Category: Resistors; Package Size: 0201; JLCPCB Basic Part: Yes; Tolerance: ±1%; Voltage Rating: 25V; Temperature Coefficient: ±200ppm/℃; Temperature Rating: -55℃~+125℃; ComponentLink1Description: Datasheet; ComponentLink1URL: https://wmsc.lcsc.com/wmsc/upload/file/pdf/v2/lcsc/1811141242_YAGEO-RC0201FR-071K74L_C327378.pdf; ComponentLink2Description: JLCPCB Part URL; ComponentLink2URL: https://jlcpcb.com/partdetail/C327378
pins: 1, 2
1 alternate drawing of the same symbol

## RC0201FR-071K87L
designator R?  Resistance: 1.87kΩ  (hidden comment: *)
Resistor, 1.87kΩ, ±1%, 50mW, 25V, ±200ppm/℃, -55℃~+125℃, SMD 0201; Manufacturer: Uniroyal; Manufacturer Part Number: RC0201FR-071K87L; Supplier 1: LCSC; Supplier Part Number 1: C474490; JLCPCB Part Number: C474490; Power Rating: 50mW; Category: Resistors; Package Size: 0201; JLCPCB Basic Part: Yes; Tolerance: ±1%; Voltage Rating: 25V; Temperature Coefficient: ±200ppm/℃; Temperature Rating: -55℃~+125℃; ComponentLink1Description: Datasheet; ComponentLink1URL: https://wmsc.lcsc.com/wmsc/upload/file/pdf/v2/lcsc/2311211101_YAGEO-RC0201FR-071K87L_C474490.pdf; ComponentLink2Description: JLCPCB Part URL; ComponentLink2URL: https://jlcpcb.com/partdetail/C474490
pins: 1, 2
1 alternate drawing of the same symbol

## RC0201FR-071KL
designator R?  Resistance: 1kΩ  (hidden comment: *)
Resistor, 1kΩ, ±1%, 50mW, 25V, ±200ppm/℃, -55℃~+125℃, SMD 0201; Manufacturer: Uniroyal; Manufacturer Part Number: RC0201FR-071KL; Supplier 1: LCSC; Supplier Part Number 1: C138165; JLCPCB Part Number: C138165; Power Rating: 50mW; Category: Resistors; Package Size: 0201; JLCPCB Basic Part: Yes; Tolerance: ±1%; Voltage Rating: 25V; Temperature Coefficient: ±200ppm/℃; Temperature Rating: -55℃~+125℃; ComponentLink1Description: Datasheet; ComponentLink1URL: https://wmsc.lcsc.com/wmsc/upload/file/pdf/v2/lcsc/2304140030_YAGEO-RC0201FR-071KL_C138165.pdf; ComponentLink2Description: JLCPCB Part URL; ComponentLink2URL: https://jlcpcb.com/partdetail/C138165
pins: 1, 2
1 alternate drawing of the same symbol

## RC0201FR-071M1L
designator R?  Resistance: 1.1MΩ  (hidden comment: *)
Resistor, 1.1MΩ, ±1%, 50mW, 25V, ±200ppm/℃, -55℃~+155℃, SMD 0201; Manufacturer: Uniroyal; Manufacturer Part Number: RC0201FR-071M1L; Supplier 1: LCSC; Supplier Part Number 1: C474455; JLCPCB Part Number: C474455; Power Rating: 50mW; Category: Resistors; Package Size: 0201; JLCPCB Basic Part: Yes; Tolerance: ±1%; Voltage Rating: 25V; Temperature Coefficient: ±200ppm/℃; Temperature Rating: -55℃~+155℃; ComponentLink1Description: Datasheet; ComponentLink1URL: https://wmsc.lcsc.com/wmsc/upload/file/pdf/v2/lcsc/2311211101_YAGEO-RC0201FR-071M1L_C474455.pdf; ComponentLink2Description: JLCPCB Part URL; ComponentLink2URL: https://jlcpcb.com/partdetail/C474455
pins: 1, 2
1 alternate drawing of the same symbol

## RC0201FR-071M2L
designator R?  Resistance: 1.2MΩ  (hidden comment: *)
Resistor, 1.2MΩ, ±1%, 50mW, 25V, ±200ppm/℃, -55℃~+125℃, SMD 0201; Manufacturer: Uniroyal; Manufacturer Part Number: RC0201FR-071M2L; Supplier 1: LCSC; Supplier Part Number 1: C142022; JLCPCB Part Number: C142022; Power Rating: 50mW; Category: Resistors; Package Size: 0201; JLCPCB Basic Part: Yes; Tolerance: ±1%; Voltage Rating: 25V; Temperature Coefficient: ±200ppm/℃; Temperature Rating: -55℃~+125℃; ComponentLink1Description: Datasheet; ComponentLink1URL: https://wmsc.lcsc.com/wmsc/upload/file/pdf/v2/lcsc/2304140030_YAGEO-RC0201FR-071M2L_C142022.pdf; ComponentLink2Description: JLCPCB Part URL; ComponentLink2URL: https://jlcpcb.com/partdetail/C142022
pins: 1, 2
1 alternate drawing of the same symbol

## RC0201FR-071M5L
designator R?  Resistance: 1.5MΩ  (hidden comment: *)
Resistor, 1.5MΩ, ±1%, 50mW, 25V, ±200ppm/℃, -55℃~+125℃, SMD 0201; Manufacturer: Uniroyal; Manufacturer Part Number: RC0201FR-071M5L; Supplier 1: LCSC; Supplier Part Number 1: C138164; JLCPCB Part Number: C138164; Power Rating: 50mW; Category: Resistors; Package Size: 0201; JLCPCB Basic Part: Yes; Tolerance: ±1%; Voltage Rating: 25V; Temperature Coefficient: ±200ppm/℃; Temperature Rating: -55℃~+125℃; ComponentLink1Description: Datasheet; ComponentLink1URL: https://wmsc.lcsc.com/wmsc/upload/file/pdf/v2/lcsc/2304140030_YAGEO-RC0201FR-071M5L_C138164.pdf; ComponentLink2Description: JLCPCB Part URL; ComponentLink2URL: https://jlcpcb.com/partdetail/C138164
pins: 1, 2
1 alternate drawing of the same symbol

## RC0201FR-071M8L
designator R?  Resistance: 1.8MΩ  (hidden comment: *)
Resistor, 1.8MΩ, ±1%, 50mW, 25V, ±200ppm/℃, -55℃~+125℃, SMD 0201; Manufacturer: Uniroyal; Manufacturer Part Number: RC0201FR-071M8L; Supplier 1: LCSC; Supplier Part Number 1: C142021; JLCPCB Part Number: C142021; Power Rating: 50mW; Category: Resistors; Package Size: 0201; JLCPCB Basic Part: Yes; Tolerance: ±1%; Voltage Rating: 25V; Temperature Coefficient: ±200ppm/℃; Temperature Rating: -55℃~+125℃; ComponentLink1Description: Datasheet; ComponentLink1URL: https://wmsc.lcsc.com/wmsc/upload/file/pdf/v2/lcsc/2304140030_YAGEO-RC0201FR-071M8L_C142021.pdf; ComponentLink2Description: JLCPCB Part URL; ComponentLink2URL: https://jlcpcb.com/partdetail/C142021
pins: 1, 2
1 alternate drawing of the same symbol

## RC0201FR-071ML
designator R?  Resistance: 1MΩ  (hidden comment: *)
Resistor, 1MΩ, ±1%, 50mW, 25V, ±200ppm/℃, -55℃~+125℃, SMD 0201; Manufacturer: Uniroyal; Manufacturer Part Number: RC0201FR-071ML; Supplier 1: LCSC; Supplier Part Number 1: C295786; JLCPCB Part Number: C295786; Power Rating: 50mW; Category: Resistors; Package Size: 0201; JLCPCB Basic Part: Yes; Tolerance: ±1%; Voltage Rating: 25V; Temperature Coefficient: ±200ppm/℃; Temperature Rating: -55℃~+125℃; ComponentLink1Description: Datasheet; ComponentLink1URL: https://wmsc.lcsc.com/wmsc/upload/file/pdf/v2/lcsc/2304140030_YAGEO-RC0201FR-071ML_C295786.pdf; ComponentLink2Description: JLCPCB Part URL; ComponentLink2URL: https://jlcpcb.com/partdetail/C295786
pins: 1, 2
1 alternate drawing of the same symbol

## RC0201FR-071RL
designator R?  Resistance: 1Ω  (hidden comment: *)
Resistor, 1Ω, ±1%, 50mW, 25V, -100ppm/℃~+350ppm/℃, -55℃~+125℃, SMD 0201; Manufacturer: Uniroyal; Manufacturer Part Number: RC0201FR-071RL; Supplier 1: LCSC; Supplier Part Number 1: C469665; JLCPCB Part Number: C469665; Power Rating: 50mW; Category: Resistors; Package Size: 0201; JLCPCB Basic Part: Yes; Tolerance: ±1%; Voltage Rating: 25V; Temperature Coefficient: -100ppm/℃~+350ppm/℃; Temperature Rating: -55℃~+125℃; ComponentLink1Description: Datasheet; ComponentLink1URL: https://wmsc.lcsc.com/wmsc/upload/file/pdf/v2/lcsc/2311211101_YAGEO-RC0201FR-071RL_C469665.pdf; ComponentLink2Description: JLCPCB Part URL; ComponentLink2URL: https://jlcpcb.com/partdetail/C469665
pins: 1, 2
1 alternate drawing of the same symbol

## RC0201FR-072K1L
designator R?  Resistance: 2.1kΩ  (hidden comment: *)
Resistor, 2.1kΩ, ±1%, 50mW, 25V, ±200ppm/℃, -55℃~+125℃, SMD 0201; Manufacturer: Uniroyal; Manufacturer Part Number: RC0201FR-072K1L; Supplier 1: LCSC; Supplier Part Number 1: C138156; JLCPCB Part Number: C138156; Power Rating: 50mW; Category: Resistors; Package Size: 0201; JLCPCB Basic Part: Yes; Tolerance: ±1%; Voltage Rating: 25V; Temperature Coefficient: ±200ppm/℃; Temperature Rating: -55℃~+125℃; ComponentLink1Description: Datasheet; ComponentLink1URL: https://wmsc.lcsc.com/wmsc/upload/file/pdf/v2/lcsc/2304140030_YAGEO-RC0201FR-072K1L_C138156.pdf; ComponentLink2Description: JLCPCB Part URL; ComponentLink2URL: https://jlcpcb.com/partdetail/C138156
pins: 1, 2
1 alternate drawing of the same symbol